# Altium schematic symbol library jlcpcb_2025_04_capacitors_extended_0402.schlib: 3594 symbols (part 16 of 20) (continued)
## GRM1555C1H1R5BA01D
designator C?  Capacitance: 1.5pF  (hidden comment: *)
Capacitor, Ceramic (MLCC), 1.5pF, 50V, C0G, SMD 0402; Manufacturer: Murata Electronics; Manufacturer Part Number: GRM1555C1H1R5BA01D; Package Size: 0402; JLCPCB Basic Part: No; JLCPCB Part Number: C76957; Supplier 1: LCSC; Category: Capacitors - MLCC; Supplier Part Number 1: C76957; Voltage Rating: 50V; Temperature Coefficient: C0G; RoHS: Yes; ComponentLink1Description: Datasheet; ComponentLink1URL: https://wmsc.lcsc.com/wmsc/upload/file/pdf/v2/lcsc/1811081616_Murata-Electronics-GRM1555C1H1R5BA01D_C76957.pdf; ComponentLink2Description: JLCPCB Part URL; ComponentLink2URL: https://jlcpcb.com/partdetail/C76957; ComponentLink3Description: LCSC Part URL; ComponentLink3URL: https://lcsc.com/product-detail/Multilayer-Ceramic-Capacitors-MLCC---SMD-SMT_Murata-Electronics-Murata-Electronics-GRM1555C1H1R5BA01D_C76957.html
footprint CAP-0402 (0402 (1005M) Capacitor)
pins: 1, 2

## GRM1555C1H1R5CA01D
designator C?  Capacitance: 1.5pF  (hidden comment: *)
Capacitor, Ceramic (MLCC), 1.5pF, 50V, C0G, SMD 0402; Manufacturer: Murata Electronics; Manufacturer Part Number: GRM1555C1H1R5CA01D; Package Size: 0402; JLCPCB Basic Part: No; JLCPCB Part Number: C76958; Supplier 1: LCSC; Category: Capacitors - MLCC; Supplier Part Number 1: C76958; Voltage Rating: 50V; Temperature Coefficient: C0G; RoHS: Yes; ComponentLink1Description: Datasheet; ComponentLink1URL: https://wmsc.lcsc.com/wmsc/upload/file/pdf/v2/lcsc/1811081613_Murata-Electronics-GRM1555C1H1R5CA01D_C76958.pdf; ComponentLink2Description: JLCPCB Part URL; ComponentLink2URL: https://jlcpcb.com/partdetail/C76958; ComponentLink3Description: LCSC Part URL; ComponentLink3URL: https://lcsc.com/product-detail/Multilayer-Ceramic-Capacitors-MLCC---SMD-SMT_Murata-Electronics-Murata-Electronics-GRM1555C1H1R5CA01D_C76958.html
footprint CAP-0402 (0402 (1005M) Capacitor)
pins: 1, 2

## GRM1555C1H1R6BA01D
designator C?  Capacitance: 1.6pF  (hidden comment: *)
Capacitor, Ceramic (MLCC), 1.6pF, 50V, C0G, SMD 0402; Manufacturer: Murata Electronics; Manufacturer Part Number: GRM1555C1H1R6BA01D; Package Size: 0402; JLCPCB Basic Part: No; JLCPCB Part Number: C88923; Supplier 1: LCSC; Category: Capacitors - MLCC; Supplier Part Number 1: C88923; Voltage Rating: 50V; Temperature Coefficient: C0G; RoHS: Yes; ComponentLink1Description: Datasheet; ComponentLink1URL: https://wmsc.lcsc.com/wmsc/upload/file/pdf/v2/lcsc/2304140030_Murata-Electronics-GRM1555C1H1R6BA01D_C88923.pdf; ComponentLink2Description: JLCPCB Part URL; ComponentLink2URL: https://jlcpcb.com/partdetail/C88923; ComponentLink3Description: LCSC Part URL; ComponentLink3URL: https://lcsc.com/product-detail/Multilayer-Ceramic-Capacitors-MLCC---SMD-SMT_Murata-Electronics-Murata-Electronics-GRM1555C1H1R6BA01D_C88923.html
footprint CAP-0402 (0402 (1005M) Capacitor)
pins: 1, 2

## GRM1555C1H1R7WA01D
designator C?  Capacitance: 1.7pF  (hidden comment: *)
Capacitor, Ceramic (MLCC), 1.7pF, 50V, C0G, SMD 0402; Manufacturer: Murata Electronics; Manufacturer Part Number: GRM1555C1H1R7WA01D; Package Size: 0402; JLCPCB Basic Part: No; JLCPCB Part Number: C3891700; Supplier 1: LCSC; Category: Capacitors - MLCC; Supplier Part Number 1: C3891700; Voltage Rating: 50V; Temperature Coefficient: C0G; RoHS: Yes; ComponentLink1Description: Datasheet; ComponentLink1URL: https://wmsc.lcsc.com/wmsc/upload/file/pdf/v2/lcsc/2308111506_Murata-Electronics-GRM1555C1H1R7WA01D_C3891700.pdf; ComponentLink2Description: JLCPCB Part URL; ComponentLink2URL: https://jlcpcb.com/partdetail/C3891700; ComponentLink3Description: LCSC Part URL; ComponentLink3URL: https://lcsc.com/product-detail/Multilayer-Ceramic-Capacitors-MLCC---SMD-SMT_Murata-Electronics-Murata-Electronics-GRM1555C1H1R7WA01D_C3891700.html
footprint CAP-0402 (0402 (1005M) Capacitor)
pins: 1, 2

## GRM1555C1H1R8WA01D
designator C?  Capacitance: 1.8pF  (hidden comment: *)
Capacitor, Ceramic (MLCC), 1.8pF, 50V, null, SMD 0402; Manufacturer: Murata Electronics; Manufacturer Part Number: GRM1555C1H1R8WA01D; Package Size: 0402; JLCPCB Basic Part: No; JLCPCB Part Number: C161538; Supplier 1: LCSC; Category: Capacitors - MLCC; Supplier Part Number 1: C161538; Voltage Rating: 50V; Temperature Coefficient: null; RoHS: Yes; ComponentLink1Description: Datasheet; ComponentLink1URL: https://wmsc.lcsc.com/wmsc/upload/file/pdf/v2/lcsc/2010221636_Murata-Electronics-GRM1555C1H1R8WA01D_C161538.pdf; ComponentLink2Description: JLCPCB Part URL; ComponentLink2URL: https://jlcpcb.com/partdetail/C161538; ComponentLink3Description: LCSC Part URL; ComponentLink3URL: https://lcsc.com/product-detail/Multilayer-Ceramic-Capacitors-MLCC---SMD-SMT_Murata-Electronics-Murata-Electronics-GRM1555C1H1R8WA01D_C161538.html
footprint CAP-0402 (0402 (1005M) Capacitor)
pins: 1, 2

## GRM1555C1H1R9WA01D
designator C?  Capacitance: 1.9pF  (hidden comment: *)
Capacitor, Ceramic (MLCC), 1.9pF, null, null, SMD 0402; Manufacturer: Murata Electronics; Manufacturer Part Number: GRM1555C1H1R9WA01D; Package Size: 0402; JLCPCB Basic Part: No; JLCPCB Part Number: C882542; Supplier 1: LCSC; Category: Capacitors - MLCC; Supplier Part Number 1: C882542; Voltage Rating: null; Temperature Coefficient: null; RoHS: Yes; ComponentLink1Description: Datasheet; ComponentLink1URL: https://wmsc.lcsc.com/wmsc/upload/file/pdf/v2/lcsc/2201242130_Murata-Electronics-GRM1555C1H1R9WA01D_C882542.pdf; ComponentLink2Description: JLCPCB Part URL; ComponentLink2URL: https://jlcpcb.com/partdetail/C882542; ComponentLink3Description: LCSC Part URL; ComponentLink3URL: https://lcsc.com/product-detail/Multilayer-Ceramic-Capacitors-MLCC---SMD-SMT_Murata-Electronics-Murata-Electronics-GRM1555C1H1R9WA01D_C882542.html
footprint CAP-0402 (0402 (1005M) Capacitor)
pins: 1, 2

## GRM1555C1H2R0WA01D
designator C?  Capacitance: 2pF  (hidden comment: *)
Capacitor, Ceramic (MLCC), 2pF, 50V, C0G, SMD 0402; Manufacturer: Murata Electronics; Manufacturer Part Number: GRM1555C1H2R0WA01D; Package Size: 0402; JLCPCB Basic Part: No; JLCPCB Part Number: C524564; Supplier 1: LCSC; Category: Capacitors - MLCC; Supplier Part Number 1: C524564; Voltage Rating: 50V; Temperature Coefficient: C0G; RoHS: Yes; ComponentLink1Description: Datasheet; ComponentLink1URL: https://wmsc.lcsc.com/wmsc/upload/file/pdf/v2/lcsc/2008191834_Murata-Electronics-GRM1555C1H2R0WA01D_C524564.pdf; ComponentLink2Description: JLCPCB Part URL; ComponentLink2URL: https://jlcpcb.com/partdetail/C524564; ComponentLink3Description: LCSC Part URL; ComponentLink3URL: https://lcsc.com/product-detail/Multilayer-Ceramic-Capacitors-MLCC---SMD-SMT_Murata-Electronics-Murata-Electronics-GRM1555C1H2R0WA01D_C524564.html
footprint CAP-0402 (0402 (1005M) Capacitor)
pins: 1, 2

## GRM1555C1H2R2BA01D
designator C?  Capacitance: 2.2pF  (hidden comment: *)
Capacitor, Ceramic (MLCC), 2.2pF, 50V, SMD 0402; Manufacturer: Murata Electronics; Manufacturer Part Number: GRM1555C1H2R2BA01D; Package Size: 0402; JLCPCB Basic Part: No; JLCPCB Part Number: C88927; Supplier 1: LCSC; Category: Capacitors - MLCC; Supplier Part Number 1: C88927; Voltage Rating: 50V; RoHS: Yes; ComponentLink1Description: Datasheet; ComponentLink1URL: https://wmsc.lcsc.com/wmsc/upload/file/pdf/v2/lcsc/2304140030_Murata-Electronics-GRM1555C1H2R2BA01D_C88927.pdf; ComponentLink2Description: JLCPCB Part URL; ComponentLink2URL: https://jlcpcb.com/partdetail/C88927; ComponentLink3Description: LCSC Part URL; ComponentLink3URL: https://lcsc.com/product-detail/Multilayer-Ceramic-Capacitors-MLCC---SMD-SMT_Murata-Electronics-Murata-Electronics-GRM1555C1H2R2BA01D_C88927.html
footprint CAP-0402 (0402 (1005M) Capacitor)
pins: 1, 2

## GRM1555C1H2R2CA01D
designator C?  Capacitance: 2.2pF  (hidden comment: *)
Capacitor, Ceramic (MLCC), 2.2pF, 50V, C0G, SMD 0402; Manufacturer: Murata Electronics; Manufacturer Part Number: GRM1555C1H2R2CA01D; Package Size: 0402; JLCPCB Basic Part: No; JLCPCB Part Number: C85938; Supplier 1: LCSC; Category: Capacitors - MLCC; Supplier Part Number 1: C85938; Voltage Rating: 50V; Temperature Coefficient: C0G; RoHS: Yes; ComponentLink1Description: Datasheet; ComponentLink1URL: https://wmsc.lcsc.com/wmsc/upload/file/pdf/v2/lcsc/2304140030_Murata-Electronics-GRM1555C1H2R2CA01D_C85938.pdf; ComponentLink2Description: JLCPCB Part URL; ComponentLink2URL: https://jlcpcb.com/partdetail/C85938; ComponentLink3Description: LCSC Part URL; ComponentLink3URL: https://lcsc.com/product-detail/Multilayer-Ceramic-Capacitors-MLCC---SMD-SMT_Murata-Electronics-Murata-Electronics-GRM1555C1H2R2CA01D_C85938.html
footprint CAP-0402 (0402 (1005M) Capacitor)
pins: 1, 2

## GRM1555C1H2R4BA01D
designator C?  Capacitance: 2.4pF  (hidden comment: *)
Capacitor, Ceramic (MLCC), 2.4pF, 50V, C0G, SMD 0402; Manufacturer: Murata Electronics; Manufacturer Part Number: GRM1555C1H2R4BA01D; Package Size: 0402; JLCPCB Basic Part: No; JLCPCB Part Number: C161548; Supplier 1: LCSC; Category: Capacitors - MLCC; Supplier Part Number 1: C161548; Voltage Rating: 50V; Temperature Coefficient: C0G; RoHS: Yes; ComponentLink1Description: Datasheet; ComponentLink1URL: https://wmsc.lcsc.com/wmsc/upload/file/pdf/v2/lcsc/1912111437_Murata-Electronics-GRM1555C1H2R4BA01D_C161548.pdf; ComponentLink2Description: JLCPCB Part URL; ComponentLink2URL: https://jlcpcb.com/partdetail/C161548; ComponentLink3Description: LCSC Part URL; ComponentLink3URL: https://lcsc.com/product-detail/Multilayer-Ceramic-Capacitors-MLCC---SMD-SMT_Murata-Electronics-Murata-Electronics-GRM1555C1H2R4BA01D_C161548.html
footprint CAP-0402 (0402 (1005M) Capacitor)
pins: 1, 2

## GRM1555C1H2R4WA01D
designator C?  Capacitance: 2.4pF  (hidden comment: *)
Capacitor, Ceramic (MLCC), 2.4pF, null, null, SMD 0402; Manufacturer: Murata Electronics; Manufacturer Part Number: GRM1555C1H2R4WA01D; Package Size: 0402; JLCPCB Basic Part: No; JLCPCB Part Number: C701201; Supplier 1: LCSC; Category: Capacitors - MLCC; Supplier Part Number 1: C701201; Voltage Rating: null; Temperature Coefficient: null; RoHS: Yes; ComponentLink1Description: Datasheet; ComponentLink1URL: https://wmsc.lcsc.com/wmsc/upload/file/pdf/v2/lcsc/2010291506_Murata-Electronics-GRM1555C1H2R4WA01D_C701201.pdf; ComponentLink2Description: JLCPCB Part URL; ComponentLink2URL: https://jlcpcb.com/partdetail/C701201; ComponentLink3Description: LCSC Part URL; ComponentLink3URL: https://lcsc.com/product-detail/Multilayer-Ceramic-Capacitors-MLCC---SMD-SMT_Murata-Electronics-Murata-Electronics-GRM1555C1H2R4WA01D_C701201.html
footprint CAP-0402 (0402 (1005M) Capacitor)
pins: 1, 2

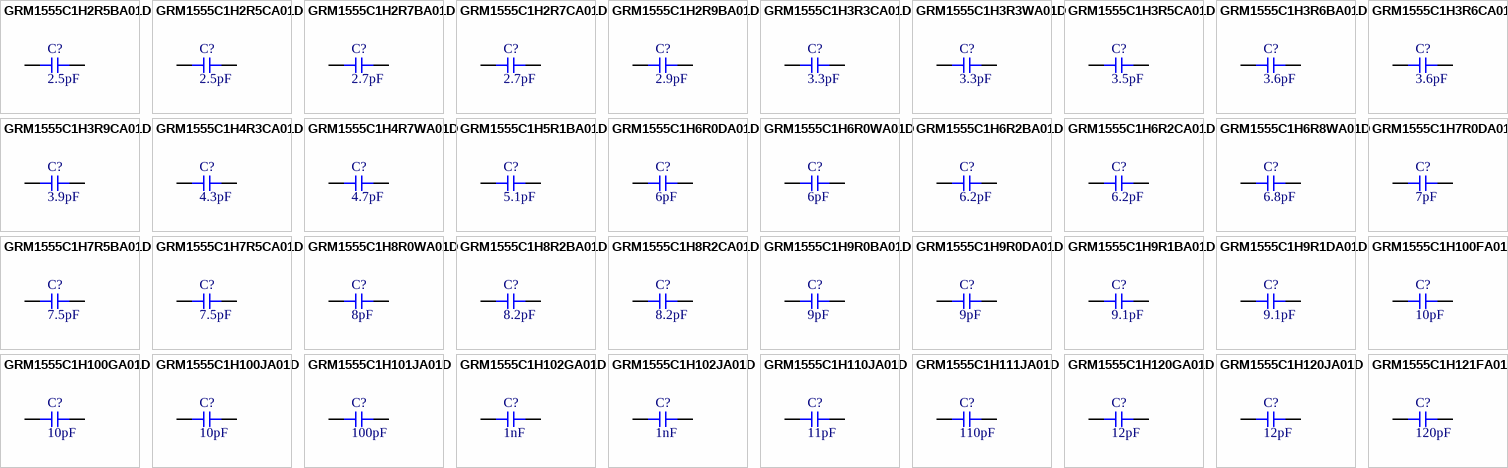
[diagram p72: symbols GRM1555C1H2R5BA01D to GRM1555C1H121FA01D]

## GRM1555C1H2R5BA01D
designator C?  Capacitance: 2.5pF  (hidden comment: *)
Capacitor, Ceramic (MLCC), 2.5pF, 50V, C0G, SMD 0402; Manufacturer: Murata Electronics; Manufacturer Part Number: GRM1555C1H2R5BA01D; Package Size: 0402; JLCPCB Basic Part: No; JLCPCB Part Number: C161549; Supplier 1: LCSC; Category: Capacitors - MLCC; Supplier Part Number 1: C161549; Voltage Rating: 50V; Temperature Coefficient: C0G; RoHS: Yes; ComponentLink1Description: Datasheet; ComponentLink1URL: https://wmsc.lcsc.com/wmsc/upload/file/pdf/v2/lcsc/1811081550_Murata-Electronics-GRM1555C1H2R5BA01D_C161549.pdf; ComponentLink2Description: JLCPCB Part URL; ComponentLink2URL: https://jlcpcb.com/partdetail/C161549; ComponentLink3Description: LCSC Part URL; ComponentLink3URL: https://lcsc.com/product-detail/Multilayer-Ceramic-Capacitors-MLCC---SMD-SMT_Murata-Electronics-Murata-Electronics-GRM1555C1H2R5BA01D_C161549.html
footprint CAP-0402 (0402 (1005M) Capacitor)
pins: 1, 2

## GRM1555C1H2R5CA01D
designator C?  Capacitance: 2.5pF  (hidden comment: *)
Capacitor, Ceramic (MLCC), 2.5pF, 50V, C0G, SMD 0402; Manufacturer: Murata Electronics; Manufacturer Part Number: GRM1555C1H2R5CA01D; Package Size: 0402; JLCPCB Basic Part: No; JLCPCB Part Number: C161550; Supplier 1: LCSC; Category: Capacitors - MLCC; Supplier Part Number 1: C161550; Voltage Rating: 50V; Temperature Coefficient: C0G; RoHS: Yes; ComponentLink1Description: Datasheet; ComponentLink1URL: https://wmsc.lcsc.com/wmsc/upload/file/pdf/v2/lcsc/2304140030_Murata-Electronics-GRM1555C1H2R5CA01D_C161550.pdf; ComponentLink2Description: JLCPCB Part URL; ComponentLink2URL: https://jlcpcb.com/partdetail/C161550; ComponentLink3Description: LCSC Part URL; ComponentLink3URL: https://lcsc.com/product-detail/Multilayer-Ceramic-Capacitors-MLCC---SMD-SMT_Murata-Electronics-Murata-Electronics-GRM1555C1H2R5CA01D_C161550.html
footprint CAP-0402 (0402 (1005M) Capacitor)
pins: 1, 2

## GRM1555C1H2R7BA01D
designator C?  Capacitance: 2.7pF  (hidden comment: *)
Capacitor, Ceramic (MLCC), 2.7pF, 50V, C0G, SMD 0402; Manufacturer: Murata Electronics; Manufacturer Part Number: GRM1555C1H2R7BA01D; Package Size: 0402; JLCPCB Basic Part: No; JLCPCB Part Number: C88928; Supplier 1: LCSC; Category: Capacitors - MLCC; Supplier Part Number 1: C88928; Voltage Rating: 50V; Temperature Coefficient: C0G; RoHS: Yes; ComponentLink1Description: Datasheet; ComponentLink1URL: https://wmsc.lcsc.com/wmsc/upload/file/pdf/v2/lcsc/2304140030_Murata-Electronics-GRM1555C1H2R7BA01D_C88928.pdf; ComponentLink2Description: JLCPCB Part URL; ComponentLink2URL: https://jlcpcb.com/partdetail/C88928; ComponentLink3Description: LCSC Part URL; ComponentLink3URL: https://lcsc.com/product-detail/Multilayer-Ceramic-Capacitors-MLCC---SMD-SMT_Murata-Electronics-Murata-Electronics-GRM1555C1H2R7BA01D_C88928.html
footprint CAP-0402 (0402 (1005M) Capacitor)
pins: 1, 2

## GRM1555C1H2R7CA01D
designator C?  Capacitance: 2.7pF  (hidden comment: *)
Capacitor, Ceramic (MLCC), 2.7pF, 50V, C0G, SMD 0402; Manufacturer: Murata Electronics; Manufacturer Part Number: GRM1555C1H2R7CA01D; Package Size: 0402; JLCPCB Basic Part: No; JLCPCB Part Number: C76963; Supplier 1: LCSC; Category: Capacitors - MLCC; Supplier Part Number 1: C76963; Voltage Rating: 50V; Temperature Coefficient: C0G; RoHS: Yes; ComponentLink1Description: Datasheet; ComponentLink1URL: https://wmsc.lcsc.com/wmsc/upload/file/pdf/v2/lcsc/1811081611_Murata-Electronics-GRM1555C1H2R7CA01D_C76963.pdf; ComponentLink2Description: JLCPCB Part URL; ComponentLink2URL: https://jlcpcb.com/partdetail/C76963; ComponentLink3Description: LCSC Part URL; ComponentLink3URL: https://lcsc.com/product-detail/Multilayer-Ceramic-Capacitors-MLCC---SMD-SMT_Murata-Electronics-Murata-Electronics-GRM1555C1H2R7CA01D_C76963.html
footprint CAP-0402 (0402 (1005M) Capacitor)
pins: 1, 2

## GRM1555C1H2R9BA01D
designator C?  Capacitance: 2.9pF  (hidden comment: *)
Capacitor, Ceramic (MLCC), 2.9pF, 50V, C0G, SMD 0402; Manufacturer: Murata Electronics; Manufacturer Part Number: GRM1555C1H2R9BA01D; Package Size: 0402; JLCPCB Basic Part: No; JLCPCB Part Number: C161551; Supplier 1: LCSC; Category: Capacitors - MLCC; Supplier Part Number 1: C161551; Voltage Rating: 50V; Temperature Coefficient: C0G; RoHS: Yes; ComponentLink1Description: Datasheet; ComponentLink1URL: https://wmsc.lcsc.com/wmsc/upload/file/pdf/v2/lcsc/2304140030_Murata-Electronics-GRM1555C1H2R9BA01D_C161551.pdf; ComponentLink2Description: JLCPCB Part URL; ComponentLink2URL: https://jlcpcb.com/partdetail/C161551; ComponentLink3Description: LCSC Part URL; ComponentLink3URL: https://lcsc.com/product-detail/Multilayer-Ceramic-Capacitors-MLCC---SMD-SMT_Murata-Electronics-Murata-Electronics-GRM1555C1H2R9BA01D_C161551.html
footprint CAP-0402 (0402 (1005M) Capacitor)
pins: 1, 2

## GRM1555C1H3R3CA01D
designator C?  Capacitance: 3.3pF  (hidden comment: *)
Capacitor, Ceramic (MLCC), 3.3pF, 50V, C0G, SMD 0402; Manufacturer: Murata Electronics; Manufacturer Part Number: GRM1555C1H3R3CA01D; Package Size: 0402; JLCPCB Basic Part: No; JLCPCB Part Number: C76968; Supplier 1: LCSC; Category: Capacitors - MLCC; Supplier Part Number 1: C76968; Voltage Rating: 50V; Temperature Coefficient: C0G; RoHS: Yes; ComponentLink1Description: Datasheet; ComponentLink1URL: https://wmsc.lcsc.com/wmsc/upload/file/pdf/v2/lcsc/1811081612_Murata-Electronics-GRM1555C1H3R3CA01D_C76968.pdf; ComponentLink2Description: JLCPCB Part URL; ComponentLink2URL: https://jlcpcb.com/partdetail/C76968; ComponentLink3Description: LCSC Part URL; ComponentLink3URL: https://lcsc.com/product-detail/Multilayer-Ceramic-Capacitors-MLCC---SMD-SMT_Murata-Electronics-Murata-Electronics-GRM1555C1H3R3CA01D_C76968.html
footprint CAP-0402 (0402 (1005M) Capacitor)
pins: 1, 2

## GRM1555C1H3R3WA01D
designator C?  Capacitance: 3.3pF  (hidden comment: *)
Capacitor, Ceramic (MLCC), 3.3pF, 50V, C0G, SMD 0402; Manufacturer: Murata Electronics; Manufacturer Part Number: GRM1555C1H3R3WA01D; Package Size: 0402; JLCPCB Basic Part: No; JLCPCB Part Number: C162102; Supplier 1: LCSC; Category: Capacitors - MLCC; Supplier Part Number 1: C162102; Voltage Rating: 50V; Temperature Coefficient: C0G; RoHS: Yes; ComponentLink1Description: Datasheet; ComponentLink1URL: https://wmsc.lcsc.com/wmsc/upload/file/pdf/v2/lcsc/1811081547_Murata-Electronics-GRM1555C1H3R3WA01D_C162102.pdf; ComponentLink2Description: JLCPCB Part URL; ComponentLink2URL: https://jlcpcb.com/partdetail/C162102; ComponentLink3Description: LCSC Part URL; ComponentLink3URL: https://lcsc.com/product-detail/Multilayer-Ceramic-Capacitors-MLCC---SMD-SMT_Murata-Electronics-Murata-Electronics-GRM1555C1H3R3WA01D_C162102.html
footprint CAP-0402 (0402 (1005M) Capacitor)
pins: 1, 2

## GRM1555C1H3R5CA01D
designator C?  Capacitance: 3.5pF  (hidden comment: *)
Capacitor, Ceramic (MLCC), 3.5pF, null, null, SMD 0402; Manufacturer: Murata Electronics; Manufacturer Part Number: GRM1555C1H3R5CA01D; Package Size: 0402; JLCPCB Basic Part: No; JLCPCB Part Number: C882541; Supplier 1: LCSC; Category: Capacitors - MLCC; Supplier Part Number 1: C882541; Voltage Rating: null; Temperature Coefficient: null; RoHS: Yes; ComponentLink1Description: Datasheet; ComponentLink1URL: https://wmsc.lcsc.com/wmsc/upload/file/pdf/v2/lcsc/2201242130_Murata-Electronics-GRM1555C1H3R5CA01D_C882541.pdf; ComponentLink2Description: JLCPCB Part URL; ComponentLink2URL: https://jlcpcb.com/partdetail/C882541; ComponentLink3Description: LCSC Part URL; ComponentLink3URL: https://lcsc.com/product-detail/Multilayer-Ceramic-Capacitors-MLCC---SMD-SMT_Murata-Electronics-Murata-Electronics-GRM1555C1H3R5CA01D_C882541.html
footprint CAP-0402 (0402 (1005M) Capacitor)
pins: 1, 2

## GRM1555C1H3R6BA01D
designator C?  Capacitance: 3.6pF  (hidden comment: *)
Capacitor, Ceramic (MLCC), 3.6pF, 50V, null, SMD 0402; Manufacturer: Murata Electronics; Manufacturer Part Number: GRM1555C1H3R6BA01D; Package Size: 0402; JLCPCB Basic Part: No; JLCPCB Part Number: C162105; Supplier 1: LCSC; Category: Capacitors - MLCC; Supplier Part Number 1: C162105; Voltage Rating: 50V; Temperature Coefficient: null; RoHS: Yes; ComponentLink1Description: Datasheet; ComponentLink1URL: https://wmsc.lcsc.com/wmsc/upload/file/pdf/v2/lcsc/2101081002_Murata-Electronics-GRM1555C1H3R6BA01D_C162105.pdf; ComponentLink2Description: JLCPCB Part URL; ComponentLink2URL: https://jlcpcb.com/partdetail/C162105; ComponentLink3Description: LCSC Part URL; ComponentLink3URL: https://lcsc.com/product-detail/Multilayer-Ceramic-Capacitors-MLCC---SMD-SMT_Murata-Electronics-Murata-Electronics-GRM1555C1H3R6BA01D_C162105.html
footprint CAP-0402 (0402 (1005M) Capacitor)
pins: 1, 2

## GRM1555C1H3R6CA01D
designator C?  Capacitance: 3.6pF  (hidden comment: *)
Capacitor, Ceramic (MLCC), 3.6pF, 50V, C0G, SMD 0402; Manufacturer: Murata Electronics; Manufacturer Part Number: GRM1555C1H3R6CA01D; Package Size: 0402; JLCPCB Basic Part: No; JLCPCB Part Number: C913745; Supplier 1: LCSC; Category: Capacitors - MLCC; Supplier Part Number 1: C913745; Voltage Rating: 50V; Temperature Coefficient: C0G; RoHS: Yes; ComponentLink1Description: Datasheet; ComponentLink1URL: https://wmsc.lcsc.com/wmsc/upload/file/pdf/v2/lcsc/2201131300_Murata-Electronics-GRM1555C1H3R6CA01D_C913745.pdf; ComponentLink2Description: JLCPCB Part URL; ComponentLink2URL: https://jlcpcb.com/partdetail/C913745; ComponentLink3Description: LCSC Part URL; ComponentLink3URL: https://lcsc.com/product-detail/Multilayer-Ceramic-Capacitors-MLCC---SMD-SMT_Murata-Electronics-Murata-Electronics-GRM1555C1H3R6CA01D_C913745.html
footprint CAP-0402 (0402 (1005M) Capacitor)
pins: 1, 2

## GRM1555C1H3R9CA01D
designator C?  Capacitance: 3.9pF  (hidden comment: *)
Capacitor, Ceramic (MLCC), 3.9pF, 50V, C0G, SMD 0402; Manufacturer: Murata Electronics; Manufacturer Part Number: GRM1555C1H3R9CA01D; Package Size: 0402; JLCPCB Basic Part: No; JLCPCB Part Number: C85940; Supplier 1: LCSC; Category: Capacitors - MLCC; Supplier Part Number 1: C85940; Voltage Rating: 50V; Temperature Coefficient: C0G; RoHS: Yes; ComponentLink1Description: Datasheet; ComponentLink1URL: https://wmsc.lcsc.com/wmsc/upload/file/pdf/v2/lcsc/2304140030_Murata-Electronics-GRM1555C1H3R9CA01D_C85940.pdf; ComponentLink2Description: JLCPCB Part URL; ComponentLink2URL: https://jlcpcb.com/partdetail/C85940; ComponentLink3Description: LCSC Part URL; ComponentLink3URL: https://lcsc.com/product-detail/Multilayer-Ceramic-Capacitors-MLCC---SMD-SMT_Murata-Electronics-Murata-Electronics-GRM1555C1H3R9CA01D_C85940.html
footprint CAP-0402 (0402 (1005M) Capacitor)
pins: 1, 2

## GRM1555C1H4R3CA01D
designator C?  Capacitance: 4.3pF  (hidden comment: *)
Capacitor, Ceramic (MLCC), 4.3pF, 50V, C0G, SMD 0402; Manufacturer: Murata Electronics; Manufacturer Part Number: GRM1555C1H4R3CA01D; Package Size: 0402; JLCPCB Basic Part: No; JLCPCB Part Number: C133047; Supplier 1: LCSC; Category: Capacitors - MLCC; Supplier Part Number 1: C133047; Voltage Rating: 50V; Temperature Coefficient: C0G; RoHS: Yes; ComponentLink1Description: Datasheet; ComponentLink1URL: https://wmsc.lcsc.com/wmsc/upload/file/pdf/v2/lcsc/2304140030_Murata-Electronics-GRM1555C1H4R3CA01D_C133047.pdf; ComponentLink2Description: JLCPCB Part URL; ComponentLink2URL: https://jlcpcb.com/partdetail/C133047; ComponentLink3Description: LCSC Part URL; ComponentLink3URL: https://lcsc.com/product-detail/Multilayer-Ceramic-Capacitors-MLCC---SMD-SMT_Murata-Electronics-Murata-Electronics-GRM1555C1H4R3CA01D_C133047.html
footprint CAP-0402 (0402 (1005M) Capacitor)
pins: 1, 2

## GRM1555C1H4R7WA01D
designator C?  Capacitance: 4.7pF  (hidden comment: *)
Capacitor, Ceramic (MLCC), 4.7pF, 50V, null, SMD 0402; Manufacturer: Murata Electronics; Manufacturer Part Number: GRM1555C1H4R7WA01D; Package Size: 0402; JLCPCB Basic Part: No; JLCPCB Part Number: C162111; Supplier 1: LCSC; Category: Capacitors - MLCC; Supplier Part Number 1: C162111; Voltage Rating: 50V; Temperature Coefficient: null; RoHS: Yes; ComponentLink1Description: Datasheet; ComponentLink1URL: https://wmsc.lcsc.com/wmsc/upload/file/pdf/v2/lcsc/2105241135_Murata-Electronics-GRM1555C1H4R7WA01D_C162111.pdf; ComponentLink2Description: JLCPCB Part URL; ComponentLink2URL: https://jlcpcb.com/partdetail/C162111; ComponentLink3Description: LCSC Part URL; ComponentLink3URL: https://lcsc.com/product-detail/Multilayer-Ceramic-Capacitors-MLCC---SMD-SMT_Murata-Electronics-Murata-Electronics-GRM1555C1H4R7WA01D_C162111.html
footprint CAP-0402 (0402 (1005M) Capacitor)
pins: 1, 2

## GRM1555C1H5R1BA01D
designator C?  Capacitance: 5.1pF  (hidden comment: *)
Capacitor, Ceramic (MLCC), 5.1pF, 50V, C0G, SMD 0402; Manufacturer: Murata Electronics; Manufacturer Part Number: GRM1555C1H5R1BA01D; Package Size: 0402; JLCPCB Basic Part: No; JLCPCB Part Number: C415534; Supplier 1: LCSC; Category: Capacitors - MLCC; Supplier Part Number 1: C415534; Voltage Rating: 50V; Temperature Coefficient: C0G; RoHS: Yes; ComponentLink1Description: Datasheet; ComponentLink1URL: https://wmsc.lcsc.com/wmsc/upload/file/pdf/v2/lcsc/2304140030_Murata-Electronics-GRM1555C1H5R1BA01D_C415534.pdf; ComponentLink2Description: JLCPCB Part URL; ComponentLink2URL: https://jlcpcb.com/partdetail/C415534; ComponentLink3Description: LCSC Part URL; ComponentLink3URL: https://lcsc.com/product-detail/Multilayer-Ceramic-Capacitors-MLCC---SMD-SMT_Murata-Electronics-Murata-Electronics-GRM1555C1H5R1BA01D_C415534.html
footprint CAP-0402 (0402 (1005M) Capacitor)
pins: 1, 2

## GRM1555C1H6R0DA01D
designator C?  Capacitance: 6pF  (hidden comment: *)
Capacitor, Ceramic (MLCC), 6pF, 50V, C0G, SMD 0402; Manufacturer: Murata Electronics; Manufacturer Part Number: GRM1555C1H6R0DA01D; Package Size: 0402; JLCPCB Basic Part: No; JLCPCB Part Number: C162119; Supplier 1: LCSC; Category: Capacitors - MLCC; Supplier Part Number 1: C162119; Voltage Rating: 50V; Temperature Coefficient: C0G; RoHS: Yes; ComponentLink1Description: Datasheet; ComponentLink1URL: https://wmsc.lcsc.com/wmsc/upload/file/pdf/v2/lcsc/2304140030_Murata-Electronics-GRM1555C1H6R0DA01D_C162119.pdf; ComponentLink2Description: JLCPCB Part URL; ComponentLink2URL: https://jlcpcb.com/partdetail/C162119; ComponentLink3Description: LCSC Part URL; ComponentLink3URL: https://lcsc.com/product-detail/Multilayer-Ceramic-Capacitors-MLCC---SMD-SMT_Murata-Electronics-Murata-Electronics-GRM1555C1H6R0DA01D_C162119.html
footprint CAP-0402 (0402 (1005M) Capacitor)
pins: 1, 2

## GRM1555C1H6R0WA01D
designator C?  Capacitance: 6pF  (hidden comment: *)
Capacitor, Ceramic (MLCC), 6pF, null, null, SMD 0402; Manufacturer: Murata Electronics; Manufacturer Part Number: GRM1555C1H6R0WA01D; Package Size: 0402; JLCPCB Basic Part: No; JLCPCB Part Number: C882540; Supplier 1: LCSC; Category: Capacitors - MLCC; Supplier Part Number 1: C882540; Voltage Rating: null; Temperature Coefficient: null; RoHS: Yes; ComponentLink1Description: Datasheet; ComponentLink1URL: https://wmsc.lcsc.com/wmsc/upload/file/pdf/v2/lcsc/2201242130_Murata-Electronics-GRM1555C1H6R0WA01D_C882540.pdf; ComponentLink2Description: JLCPCB Part URL; ComponentLink2URL: https://jlcpcb.com/partdetail/C882540; ComponentLink3Description: LCSC Part URL; ComponentLink3URL: https://lcsc.com/product-detail/Multilayer-Ceramic-Capacitors-MLCC---SMD-SMT_Murata-Electronics-Murata-Electronics-GRM1555C1H6R0WA01D_C882540.html
footprint CAP-0402 (0402 (1005M) Capacitor)
pins: 1, 2

## GRM1555C1H6R2BA01D
designator C?  Capacitance: 6.2pF  (hidden comment: *)
Capacitor, Ceramic (MLCC), 6.2pF, null, null, SMD 0402; Manufacturer: Murata Electronics; Manufacturer Part Number: GRM1555C1H6R2BA01D; Package Size: 0402; JLCPCB Basic Part: No; JLCPCB Part Number: C237438; Supplier 1: LCSC; Category: Capacitors - MLCC; Supplier Part Number 1: C237438; Voltage Rating: null; Temperature Coefficient: null; RoHS: Yes; ComponentLink1Description: Datasheet; ComponentLink1URL: https://wmsc.lcsc.com/wmsc/upload/file/pdf/v2/lcsc/2304140030_Murata-Electronics-GRM1555C1H6R2BA01D_C237438.pdf; ComponentLink2Description: JLCPCB Part URL; ComponentLink2URL: https://jlcpcb.com/partdetail/C237438; ComponentLink3Description: LCSC Part URL; ComponentLink3URL: https://lcsc.com/product-detail/Multilayer-Ceramic-Capacitors-MLCC---SMD-SMT_Murata-Electronics-Murata-Electronics-GRM1555C1H6R2BA01D_C237438.html
footprint CAP-0402 (0402 (1005M) Capacitor)
pins: 1, 2

## GRM1555C1H6R2CA01D
designator C?  Capacitance: 6.2pF  (hidden comment: *)
Capacitor, Ceramic (MLCC), 6.2pF, 50V, C0G, SMD 0402; Manufacturer: Murata Electronics; Manufacturer Part Number: GRM1555C1H6R2CA01D; Package Size: 0402; JLCPCB Basic Part: No; JLCPCB Part Number: C82154; Supplier 1: LCSC; Category: Capacitors - MLCC; Supplier Part Number 1: C82154; Voltage Rating: 50V; Temperature Coefficient: C0G; RoHS: Yes; ComponentLink1Description: Datasheet; ComponentLink1URL: https://wmsc.lcsc.com/wmsc/upload/file/pdf/v2/lcsc/1811081617_Murata-Electronics-GRM1555C1H6R2CA01D_C82154.pdf; ComponentLink2Description: JLCPCB Part URL; ComponentLink2URL: https://jlcpcb.com/partdetail/C82154; ComponentLink3Description: LCSC Part URL; ComponentLink3URL: https://lcsc.com/product-detail/Multilayer-Ceramic-Capacitors-MLCC---SMD-SMT_Murata-Electronics-Murata-Electronics-GRM1555C1H6R2CA01D_C82154.html
footprint CAP-0402 (0402 (1005M) Capacitor)
pins: 1, 2

## GRM1555C1H6R8WA01D
designator C?  Capacitance: 6.8pF  (hidden comment: *)
Capacitor, Ceramic (MLCC), 6.8pF, null, null, SMD 0402; Manufacturer: Murata Electronics; Manufacturer Part Number: GRM1555C1H6R8WA01D; Package Size: 0402; JLCPCB Basic Part: No; JLCPCB Part Number: C913753; Supplier 1: LCSC; Category: Capacitors - MLCC; Supplier Part Number 1: C913753; Voltage Rating: null; Temperature Coefficient: null; RoHS: Yes; ComponentLink1Description: Datasheet; ComponentLink1URL: https://wmsc.lcsc.com/wmsc/upload/file/pdf/v2/lcsc/2201131300_Murata-Electronics-GRM1555C1H6R8WA01D_C913753.pdf; ComponentLink2Description: JLCPCB Part URL; ComponentLink2URL: https://jlcpcb.com/partdetail/C913753; ComponentLink3Description: LCSC Part URL; ComponentLink3URL: https://lcsc.com/product-detail/Multilayer-Ceramic-Capacitors-MLCC---SMD-SMT_Murata-Electronics-Murata-Electronics-GRM1555C1H6R8WA01D_C913753.html
footprint CAP-0402 (0402 (1005M) Capacitor)
pins: 1, 2

## GRM1555C1H7R0DA01D
designator C?  Capacitance: 7pF  (hidden comment: *)
Capacitor, Ceramic (MLCC), 7pF, 50V, C0G, SMD 0402; Manufacturer: Murata Electronics; Manufacturer Part Number: GRM1555C1H7R0DA01D; Package Size: 0402; JLCPCB Basic Part: No; JLCPCB Part Number: C162122; Supplier 1: LCSC; Category: Capacitors - MLCC; Supplier Part Number 1: C162122; Voltage Rating: 50V; Temperature Coefficient: C0G; RoHS: Yes; ComponentLink1Description: Datasheet; ComponentLink1URL: https://wmsc.lcsc.com/wmsc/upload/file/pdf/v2/lcsc/2304140030_Murata-Electronics-GRM1555C1H7R0DA01D_C162122.pdf; ComponentLink2Description: JLCPCB Part URL; ComponentLink2URL: https://jlcpcb.com/partdetail/C162122; ComponentLink3Description: LCSC Part URL; ComponentLink3URL: https://lcsc.com/product-detail/Multilayer-Ceramic-Capacitors-MLCC---SMD-SMT_Murata-Electronics-Murata-Electronics-GRM1555C1H7R0DA01D_C162122.html
footprint CAP-0402 (0402 (1005M) Capacitor)
pins: 1, 2

## GRM1555C1H7R5BA01D
designator C?  Capacitance: 7.5pF  (hidden comment: *)
Capacitor, Ceramic (MLCC), 7.5pF, 50V, C0G, SMD 0402; Manufacturer: Murata Electronics; Manufacturer Part Number: GRM1555C1H7R5BA01D; Package Size: 0402; JLCPCB Basic Part: No; JLCPCB Part Number: C88938; Supplier 1: LCSC; Category: Capacitors - MLCC; Supplier Part Number 1: C88938; Voltage Rating: 50V; Temperature Coefficient: C0G; RoHS: Yes; ComponentLink1Description: Datasheet; ComponentLink1URL: https://wmsc.lcsc.com/wmsc/upload/file/pdf/v2/lcsc/2304140030_Murata-Electronics-GRM1555C1H7R5BA01D_C88938.pdf; ComponentLink2Description: JLCPCB Part URL; ComponentLink2URL: https://jlcpcb.com/partdetail/C88938; ComponentLink3Description: LCSC Part URL; ComponentLink3URL: https://lcsc.com/product-detail/Multilayer-Ceramic-Capacitors-MLCC---SMD-SMT_Murata-Electronics-Murata-Electronics-GRM1555C1H7R5BA01D_C88938.html
footprint CAP-0402 (0402 (1005M) Capacitor)
pins: 1, 2

## GRM1555C1H7R5CA01D
designator C?  Capacitance: 7.5pF  (hidden comment: *)
Capacitor, Ceramic (MLCC), 7.5pF, 50V, C0G, SMD 0402; Manufacturer: Murata Electronics; Manufacturer Part Number: GRM1555C1H7R5CA01D; Package Size: 0402; JLCPCB Basic Part: No; JLCPCB Part Number: C415533; Supplier 1: LCSC; Category: Capacitors - MLCC; Supplier Part Number 1: C415533; Voltage Rating: 50V; Temperature Coefficient: C0G; RoHS: Yes; ComponentLink1Description: Datasheet; ComponentLink1URL: https://wmsc.lcsc.com/wmsc/upload/file/pdf/v2/lcsc/2304140030_Murata-Electronics-GRM1555C1H7R5CA01D_C415533.pdf; ComponentLink2Description: JLCPCB Part URL; ComponentLink2URL: https://jlcpcb.com/partdetail/C415533; ComponentLink3Description: LCSC Part URL; ComponentLink3URL: https://lcsc.com/product-detail/Multilayer-Ceramic-Capacitors-MLCC---SMD-SMT_Murata-Electronics-Murata-Electronics-GRM1555C1H7R5CA01D_C415533.html
footprint CAP-0402 (0402 (1005M) Capacitor)
pins: 1, 2

## GRM1555C1H8R0WA01D
designator C?  Capacitance: 8pF  (hidden comment: *)
Capacitor, Ceramic (MLCC), 8pF, null, null, SMD 0402; Manufacturer: Murata Electronics; Manufacturer Part Number: GRM1555C1H8R0WA01D; Package Size: 0402; JLCPCB Basic Part: No; JLCPCB Part Number: C701199; Supplier 1: LCSC; Category: Capacitors - MLCC; Supplier Part Number 1: C701199; Voltage Rating: null; Temperature Coefficient: null; RoHS: Yes; ComponentLink1Description: Datasheet; ComponentLink1URL: https://wmsc.lcsc.com/wmsc/upload/file/pdf/v2/lcsc/2011121335_Murata-Electronics-GRM1555C1H8R0WA01D_C701199.pdf; ComponentLink2Description: JLCPCB Part URL; ComponentLink2URL: https://jlcpcb.com/partdetail/C701199; ComponentLink3Description: LCSC Part URL; ComponentLink3URL: https://lcsc.com/product-detail/Multilayer-Ceramic-Capacitors-MLCC---SMD-SMT_Murata-Electronics-Murata-Electronics-GRM1555C1H8R0WA01D_C701199.html
footprint CAP-0402 (0402 (1005M) Capacitor)
pins: 1, 2

## GRM1555C1H8R2BA01D
designator C?  Capacitance: 8.2pF  (hidden comment: *)
Capacitor, Ceramic (MLCC), 8.2pF, 50V, C0G, SMD 0402; Manufacturer: Murata Electronics; Manufacturer Part Number: GRM1555C1H8R2BA01D; Package Size: 0402; JLCPCB Basic Part: No; JLCPCB Part Number: C85944; Supplier 1: LCSC; Category: Capacitors - MLCC; Supplier Part Number 1: C85944; Voltage Rating: 50V; Temperature Coefficient: C0G; RoHS: Yes; ComponentLink1Description: Datasheet; ComponentLink1URL: https://wmsc.lcsc.com/wmsc/upload/file/pdf/v2/lcsc/2304140030_Murata-Electronics-GRM1555C1H8R2BA01D_C85944.pdf; ComponentLink2Description: JLCPCB Part URL; ComponentLink2URL: https://jlcpcb.com/partdetail/C85944; ComponentLink3Description: LCSC Part URL; ComponentLink3URL: https://lcsc.com/product-detail/Multilayer-Ceramic-Capacitors-MLCC---SMD-SMT_Murata-Electronics-Murata-Electronics-GRM1555C1H8R2BA01D_C85944.html
footprint CAP-0402 (0402 (1005M) Capacitor)
pins: 1, 2

## GRM1555C1H8R2CA01D
designator C?  Capacitance: 8.2pF  (hidden comment: *)
Capacitor, Ceramic (MLCC), 8.2pF, 50V, C0G, SMD 0402; Manufacturer: Murata Electronics; Manufacturer Part Number: GRM1555C1H8R2CA01D; Package Size: 0402; JLCPCB Basic Part: No; JLCPCB Part Number: C76984; Supplier 1: LCSC; Category: Capacitors - MLCC; Supplier Part Number 1: C76984; Voltage Rating: 50V; Temperature Coefficient: C0G; RoHS: Yes; ComponentLink1Description: Datasheet; ComponentLink1URL: https://wmsc.lcsc.com/wmsc/upload/file/pdf/v2/lcsc/1811081615_Murata-Electronics-GRM1555C1H8R2CA01D_C76984.pdf; ComponentLink2Description: JLCPCB Part URL; ComponentLink2URL: https://jlcpcb.com/partdetail/C76984; ComponentLink3Description: LCSC Part URL; ComponentLink3URL: https://lcsc.com/product-detail/Multilayer-Ceramic-Capacitors-MLCC---SMD-SMT_Murata-Electronics-Murata-Electronics-GRM1555C1H8R2CA01D_C76984.html
footprint CAP-0402 (0402 (1005M) Capacitor)
pins: 1, 2

## GRM1555C1H9R0BA01D
designator C?  Capacitance: 9pF  (hidden comment: *)
Capacitor, Ceramic (MLCC), 9pF, 50V, C0G, SMD 0402; Manufacturer: Murata Electronics; Manufacturer Part Number: GRM1555C1H9R0BA01D; Package Size: 0402; JLCPCB Basic Part: No; JLCPCB Part Number: C162127; Supplier 1: LCSC; Category: Capacitors - MLCC; Supplier Part Number 1: C162127; Voltage Rating: 50V; Temperature Coefficient: C0G; RoHS: Yes; ComponentLink1Description: Datasheet; ComponentLink1URL: https://wmsc.lcsc.com/wmsc/upload/file/pdf/v2/lcsc/2304140030_Murata-Electronics-GRM1555C1H9R0BA01D_C162127.pdf; ComponentLink2Description: JLCPCB Part URL; ComponentLink2URL: https://jlcpcb.com/partdetail/C162127; ComponentLink3Description: LCSC Part URL; ComponentLink3URL: https://lcsc.com/product-detail/Multilayer-Ceramic-Capacitors-MLCC---SMD-SMT_Murata-Electronics-Murata-Electronics-GRM1555C1H9R0BA01D_C162127.html
footprint CAP-0402 (0402 (1005M) Capacitor)
pins: 1, 2

## GRM1555C1H9R0DA01D
designator C?  Capacitance: 9pF  (hidden comment: *)
Capacitor, Ceramic (MLCC), 9pF, null, null, SMD 0402; Manufacturer: Murata Electronics; Manufacturer Part Number: GRM1555C1H9R0DA01D; Package Size: 0402; JLCPCB Basic Part: No; JLCPCB Part Number: C426043; Supplier 1: LCSC; Category: Capacitors - MLCC; Supplier Part Number 1: C426043; Voltage Rating: null; Temperature Coefficient: null; RoHS: Yes; ComponentLink1Description: Datasheet; ComponentLink1URL: https://wmsc.lcsc.com/wmsc/upload/file/pdf/v2/lcsc/2304140030_Murata-Electronics-GRM1555C1H9R0DA01D_C426043.pdf; ComponentLink2Description: JLCPCB Part URL; ComponentLink2URL: https://jlcpcb.com/partdetail/C426043; ComponentLink3Description: LCSC Part URL; ComponentLink3URL: https://lcsc.com/product-detail/Multilayer-Ceramic-Capacitors-MLCC---SMD-SMT_Murata-Electronics-Murata-Electronics-GRM1555C1H9R0DA01D_C426043.html
footprint CAP-0402 (0402 (1005M) Capacitor)
pins: 1, 2

## GRM1555C1H9R1BA01D
designator C?  Capacitance: 9.1pF  (hidden comment: *)
Capacitor, Ceramic (MLCC), 9.1pF, 50V, C0G, SMD 0402; Manufacturer: Murata Electronics; Manufacturer Part Number: GRM1555C1H9R1BA01D; Package Size: 0402; JLCPCB Basic Part: No; JLCPCB Part Number: C76986; Supplier 1: LCSC; Category: Capacitors - MLCC; Supplier Part Number 1: C76986; Voltage Rating: 50V; Temperature Coefficient: C0G; RoHS: Yes; ComponentLink1Description: Datasheet; ComponentLink1URL: https://wmsc.lcsc.com/wmsc/upload/file/pdf/v2/lcsc/1811081612_Murata-Electronics-GRM1555C1H9R1BA01D_C76986.pdf; ComponentLink2Description: JLCPCB Part URL; ComponentLink2URL: https://jlcpcb.com/partdetail/C76986; ComponentLink3Description: LCSC Part URL; ComponentLink3URL: https://lcsc.com/product-detail/Multilayer-Ceramic-Capacitors-MLCC---SMD-SMT_Murata-Electronics-Murata-Electronics-GRM1555C1H9R1BA01D_C76986.html
footprint CAP-0402 (0402 (1005M) Capacitor)
pins: 1, 2

## GRM1555C1H9R1DA01D
designator C?  Capacitance: 9.1pF  (hidden comment: *)
Capacitor, Ceramic (MLCC), 9.1pF, 50V, C0G, SMD 0402; Manufacturer: Murata Electronics; Manufacturer Part Number: GRM1555C1H9R1DA01D; Package Size: 0402; JLCPCB Basic Part: No; JLCPCB Part Number: C415411; Supplier 1: LCSC; Category: Capacitors - MLCC; Supplier Part Number 1: C415411; Voltage Rating: 50V; Temperature Coefficient: C0G; RoHS: Yes; ComponentLink1Description: Datasheet; ComponentLink1URL: https://wmsc.lcsc.com/wmsc/upload/file/pdf/v2/lcsc/2304140030_Murata-Electronics-GRM1555C1H9R1DA01D_C415411.pdf; ComponentLink2Description: JLCPCB Part URL; ComponentLink2URL: https://jlcpcb.com/partdetail/C415411; ComponentLink3Description: LCSC Part URL; ComponentLink3URL: https://lcsc.com/product-detail/Multilayer-Ceramic-Capacitors-MLCC---SMD-SMT_Murata-Electronics-Murata-Electronics-GRM1555C1H9R1DA01D_C415411.html
footprint CAP-0402 (0402 (1005M) Capacitor)
pins: 1, 2

## GRM1555C1H100FA01D
designator C?  Capacitance: 10pF  (hidden comment: *)
Capacitor, Ceramic (MLCC), 10pF, ±1%, 50V, C0G, ±1%, SMD 0402; Manufacturer: Murata Electronics; Manufacturer Part Number: GRM1555C1H100FA01D; Package Size: 0402; JLCPCB Basic Part: No; JLCPCB Part Number: C161520; Supplier 1: LCSC; Category: Capacitors - MLCC; Supplier Part Number 1: C161520; Tolerance: ±1%; Voltage Rating: 50V; Temperature Coefficient: C0G; RoHS: Yes; ComponentLink1Description: Datasheet; ComponentLink1URL: https://wmsc.lcsc.com/wmsc/upload/file/pdf/v2/lcsc/1811081522_Murata-Electronics-GRM1555C1H100FA01D_C161520.pdf; ComponentLink2Description: JLCPCB Part URL; ComponentLink2URL: https://jlcpcb.com/partdetail/C161520; ComponentLink3Description: LCSC Part URL; ComponentLink3URL: https://lcsc.com/product-detail/Multilayer-Ceramic-Capacitors-MLCC---SMD-SMT_Murata-Electronics-Murata-Electronics-GRM1555C1H100FA01D_C161520.html
footprint CAP-0402 (0402 (1005M) Capacitor)
pins: 1, 2

## GRM1555C1H100GA01D
designator C?  Capacitance: 10pF  (hidden comment: *)
Capacitor, Ceramic (MLCC), 10pF, ±2%, 50V, C0G, ±2%, SMD 0402; Manufacturer: Murata Electronics; Manufacturer Part Number: GRM1555C1H100GA01D; Package Size: 0402; JLCPCB Basic Part: No; JLCPCB Part Number: C76945; Supplier 1: LCSC; Category: Capacitors - MLCC; Supplier Part Number 1: C76945; Tolerance: ±2%; Voltage Rating: 50V; Temperature Coefficient: C0G; RoHS: Yes; ComponentLink1Description: Datasheet; ComponentLink1URL: https://wmsc.lcsc.com/wmsc/upload/file/pdf/v2/lcsc/1811081612_Murata-Electronics-GRM1555C1H100GA01D_C76945.pdf; ComponentLink2Description: JLCPCB Part URL; ComponentLink2URL: https://jlcpcb.com/partdetail/C76945; ComponentLink3Description: LCSC Part URL; ComponentLink3URL: https://lcsc.com/product-detail/Multilayer-Ceramic-Capacitors-MLCC---SMD-SMT_Murata-Electronics-Murata-Electronics-GRM1555C1H100GA01D_C76945.html
footprint CAP-0402 (0402 (1005M) Capacitor)
pins: 1, 2

## GRM1555C1H100JA01D
designator C?  Capacitance: 10pF  (hidden comment: *)
Capacitor, Ceramic (MLCC), 10pF, ±5%, 50V, C0G, ±5%, SMD 0402; Manufacturer: Murata Electronics; Manufacturer Part Number: GRM1555C1H100JA01D; Package Size: 0402; JLCPCB Basic Part: No; JLCPCB Part Number: C76946; Supplier 1: LCSC; Category: Capacitors - MLCC; Supplier Part Number 1: C76946; Tolerance: ±5%; Voltage Rating: 50V; Temperature Coefficient: C0G; RoHS: Yes; ComponentLink1Description: Datasheet; ComponentLink1URL: https://wmsc.lcsc.com/wmsc/upload/file/pdf/v2/lcsc/1811081611_Murata-Electronics-GRM1555C1H100JA01D_C76946.pdf; ComponentLink2Description: JLCPCB Part URL; ComponentLink2URL: https://jlcpcb.com/partdetail/C76946; ComponentLink3Description: LCSC Part URL; ComponentLink3URL: https://lcsc.com/product-detail/Multilayer-Ceramic-Capacitors-MLCC---SMD-SMT_Murata-Electronics-Murata-Electronics-GRM1555C1H100JA01D_C76946.html
footprint CAP-0402 (0402 (1005M) Capacitor)
pins: 1, 2

## GRM1555C1H101JA01D
designator C?  Capacitance: 100pF  (hidden comment: *)
Capacitor, Ceramic (MLCC), 100pF, ±5%, 50V, C0G, ±5%, SMD 0402; Manufacturer: Murata Electronics; Manufacturer Part Number: GRM1555C1H101JA01D; Package Size: 0402; JLCPCB Basic Part: No; JLCPCB Part Number: C77177; Supplier 1: LCSC; Category: Capacitors - MLCC; Supplier Part Number 1: C77177; Tolerance: ±5%; Voltage Rating: 50V; Temperature Coefficient: C0G; RoHS: Yes; ComponentLink1Description: Datasheet; ComponentLink1URL: https://wmsc.lcsc.com/wmsc/upload/file/pdf/v2/lcsc/1811081617_Murata-Electronics-GRM1555C1H101JA01D_C77177.pdf; ComponentLink2Description: JLCPCB Part URL; ComponentLink2URL: https://jlcpcb.com/partdetail/C77177; ComponentLink3Description: LCSC Part URL; ComponentLink3URL: https://lcsc.com/product-detail/Multilayer-Ceramic-Capacitors-MLCC---SMD-SMT_Murata-Electronics-Murata-Electronics-GRM1555C1H101JA01D_C77177.html
footprint CAP-0402 (0402 (1005M) Capacitor)
pins: 1, 2

## GRM1555C1H102GA01D
designator C?  Capacitance: 1nF  (hidden comment: *)
Capacitor, Ceramic (MLCC), 1nF, ±2%, 50V, null, ±2%, SMD 0402; Manufacturer: Murata Electronics; Manufacturer Part Number: GRM1555C1H102GA01D; Package Size: 0402; JLCPCB Basic Part: No; JLCPCB Part Number: C2167623; Supplier 1: LCSC; Category: Capacitors - MLCC; Supplier Part Number 1: C2167623; Tolerance: ±2%; Voltage Rating: 50V; Temperature Coefficient: null; RoHS: Yes; ComponentLink1Description: Datasheet; ComponentLink1URL: https://wmsc.lcsc.com/wmsc/upload/file/pdf/v2/lcsc/2308111632_Murata-Electronics-GRM1555C1H102GA01D_C2167623.pdf; ComponentLink2Description: JLCPCB Part URL; ComponentLink2URL: https://jlcpcb.com/partdetail/C2167623; ComponentLink3Description: LCSC Part URL; ComponentLink3URL: https://lcsc.com/product-detail/Multilayer-Ceramic-Capacitors-MLCC---SMD-SMT_Murata-Electronics-Murata-Electronics-GRM1555C1H102GA01D_C2167623.html
footprint CAP-0402 (0402 (1005M) Capacitor)
pins: 1, 2

## GRM1555C1H102JA01D
designator C?  Capacitance: 1nF  (hidden comment: *)
Capacitor, Ceramic (MLCC), 1nF, ±5%, 50V, C0G, ±5%, SMD 0402; Manufacturer: Murata Electronics; Manufacturer Part Number: GRM1555C1H102JA01D; Package Size: 0402; JLCPCB Basic Part: No; JLCPCB Part Number: C76947; Supplier 1: LCSC; Category: Capacitors - MLCC; Supplier Part Number 1: C76947; Tolerance: ±5%; Voltage Rating: 50V; Temperature Coefficient: C0G; RoHS: Yes; ComponentLink1Description: Datasheet; ComponentLink1URL: https://wmsc.lcsc.com/wmsc/upload/file/pdf/v2/lcsc/1811081610_Murata-Electronics-GRM1555C1H102JA01D_C76947.pdf; ComponentLink2Description: JLCPCB Part URL; ComponentLink2URL: https://jlcpcb.com/partdetail/C76947; ComponentLink3Description: LCSC Part URL; ComponentLink3URL: https://lcsc.com/product-detail/Multilayer-Ceramic-Capacitors-MLCC---SMD-SMT_Murata-Electronics-Murata-Electronics-GRM1555C1H102JA01D_C76947.html
footprint CAP-0402 (0402 (1005M) Capacitor)
pins: 1, 2

## GRM1555C1H110JA01D
designator C?  Capacitance: 11pF  (hidden comment: *)
Capacitor, Ceramic (MLCC), 11pF, ±5%, 50V, C0G, ±5%, SMD 0402; Manufacturer: Murata Electronics; Manufacturer Part Number: GRM1555C1H110JA01D; Package Size: 0402; JLCPCB Basic Part: No; JLCPCB Part Number: C161525; Supplier 1: LCSC; Category: Capacitors - MLCC; Supplier Part Number 1: C161525; Tolerance: ±5%; Voltage Rating: 50V; Temperature Coefficient: C0G; RoHS: Yes; ComponentLink1Description: Datasheet; ComponentLink1URL: https://wmsc.lcsc.com/wmsc/upload/file/pdf/v2/lcsc/2304140030_Murata-Electronics-GRM1555C1H110JA01D_C161525.pdf; ComponentLink2Description: JLCPCB Part URL; ComponentLink2URL: https://jlcpcb.com/partdetail/C161525; ComponentLink3Description: LCSC Part URL; ComponentLink3URL: https://lcsc.com/product-detail/Multilayer-Ceramic-Capacitors-MLCC---SMD-SMT_Murata-Electronics-Murata-Electronics-GRM1555C1H110JA01D_C161525.html
footprint CAP-0402 (0402 (1005M) Capacitor)
pins: 1, 2
